# Altium integrated library analogboard_v2.IntLib: 537 symbols (part 2 of 4)
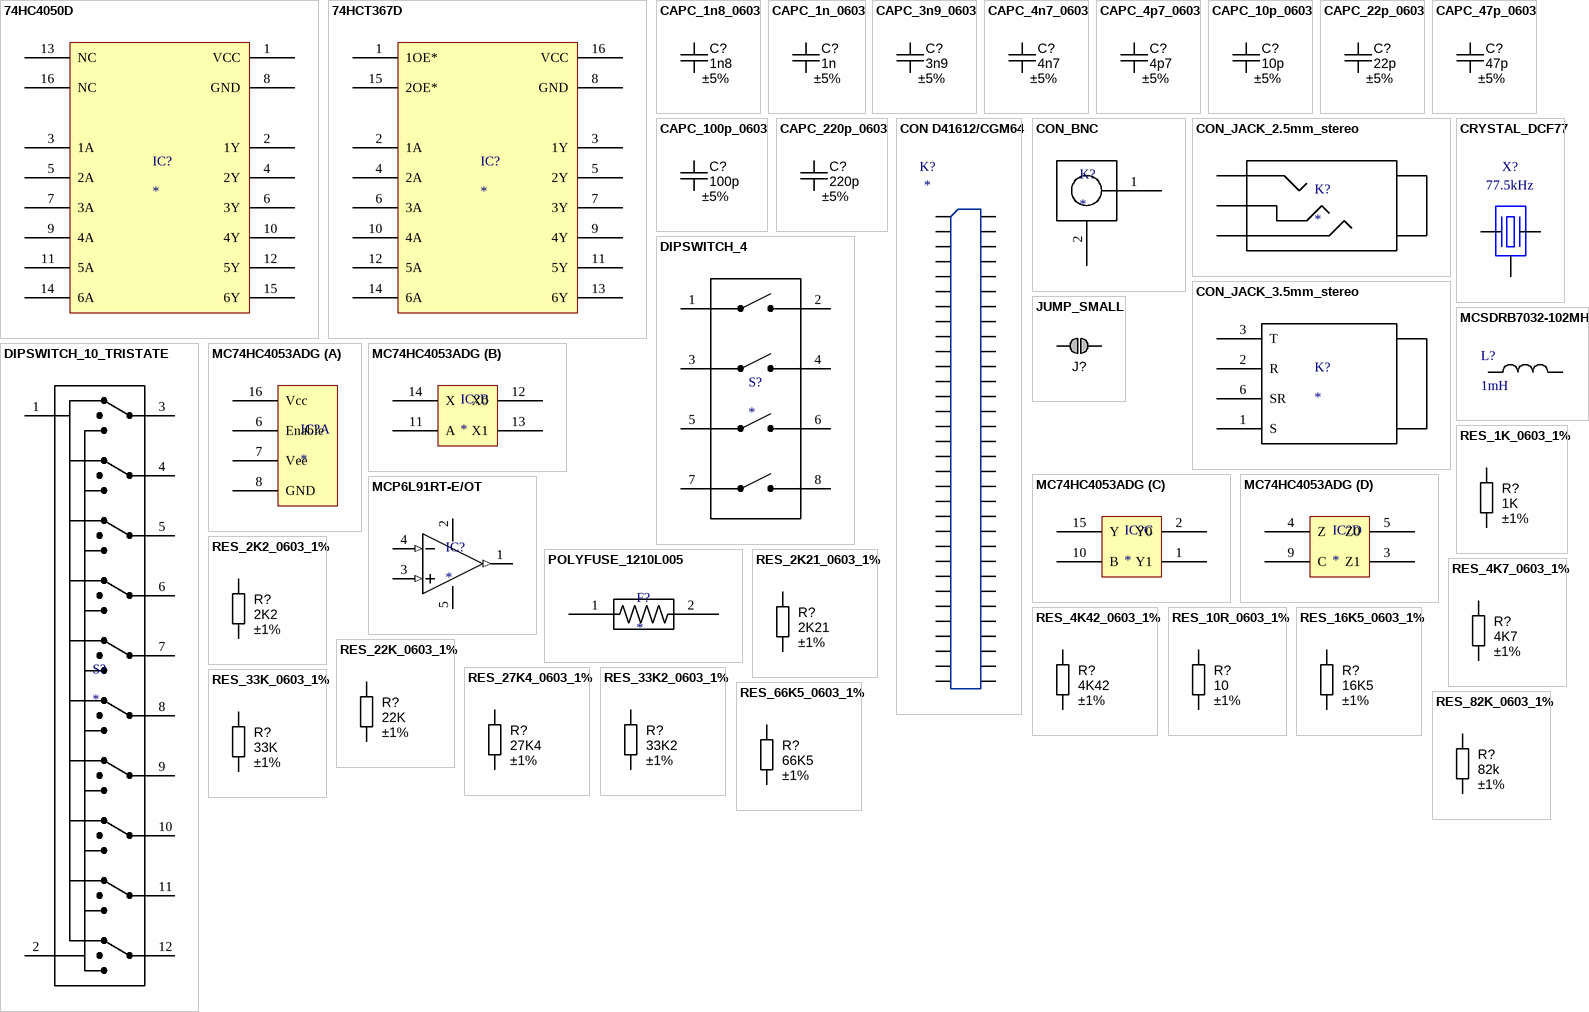
[diagram p32: symbols 74HC4050D to RES_82K_0603_1%]

## RES_16K5_0603_1%
designator R?, comment value 16K5  Tolerance: ±1%  (hidden comment: Thick Film)
Resistor SMD chip 16.5k Ohm 0.1W 1% 0603; Ratings: 1/10W; Package / Case: 0603 (1608 Metric)
footprint RESC1608N (Chip Resistor, Body 1.6x0.8mm, 0603, IPC Medium Density)
pins: 1, 2

## RES_22K_0603_1%
designator R?, comment value 22K  Tolerance: ±1%  (hidden comment: Thick Film)
Resistor SMD chip 22k Ohm 0.1W 1% 0603; Ratings: 1/10W; Package / Case: 0603 (1608 Metric)
footprint RESC1608N (Chip Resistor, Body 1.6x0.8mm, 0603, IPC Medium Density)
pins: 1, 2

## RES_27K4_0603_1%
designator R?, comment value 27K4  Tolerance: ±1%  (hidden comment: Thick Film)
Resistor SMD chip 27.4k Ohm 0.1W 1% 0603; Ratings: 1/10W; Package / Case: 0603 (1608 Metric)
footprint RESC1608N (Chip Resistor, Body 1.6x0.8mm, 0603, IPC Medium Density)
pins: 1, 2

## RES_33K2_0603_1%
designator R?, comment value 33K2  Tolerance: ±1%  (hidden comment: Thick Film)
Resistor SMD chip 33.2k Ohm 0.1W 1% 0603; Ratings: 1/10W; Package / Case: 0603 (1608 Metric)
footprint RESC1608N (Chip Resistor, Body 1.6x0.8mm, 0603, IPC Medium Density)
pins: 1, 2

## RES_33K_0603_1%
designator R?, comment value 33K  Tolerance: ±1%  (hidden comment: Thick Film)
Resistor SMD chip 33k Ohm 0.1W 1% 0603; Ratings: 1/10W; Package / Case: 0603 (1608 Metric)
footprint RESC1608N (Chip Resistor, Body 1.6x0.8mm, 0603, IPC Medium Density)
pins: 1, 2

## RES_66K5_0603_1%
designator R?, comment value 66K5  Tolerance: ±1%  (hidden comment: Thick Film)
Resistor SMD chip 66.5k Ohm 0.1W 1% 0603; Ratings: 1/10W; Package / Case: 0603 (1608 Metric)
footprint RESC1608N (Chip Resistor, Body 1.6x0.8mm, 0603, IPC Medium Density)
pins: 1, 2

## RES_82K_0603_1%
designator R?, comment value 82k  Tolerance: ±1%  (hidden comment: Thick Film)
Resistor SMD chip 82k Ohm 0.1W 1% 0603; Ratings: 1/10W; Package / Case: 0603 (1608 Metric)
footprint RESC1608N (Footprint not found)
pins: 1, 2

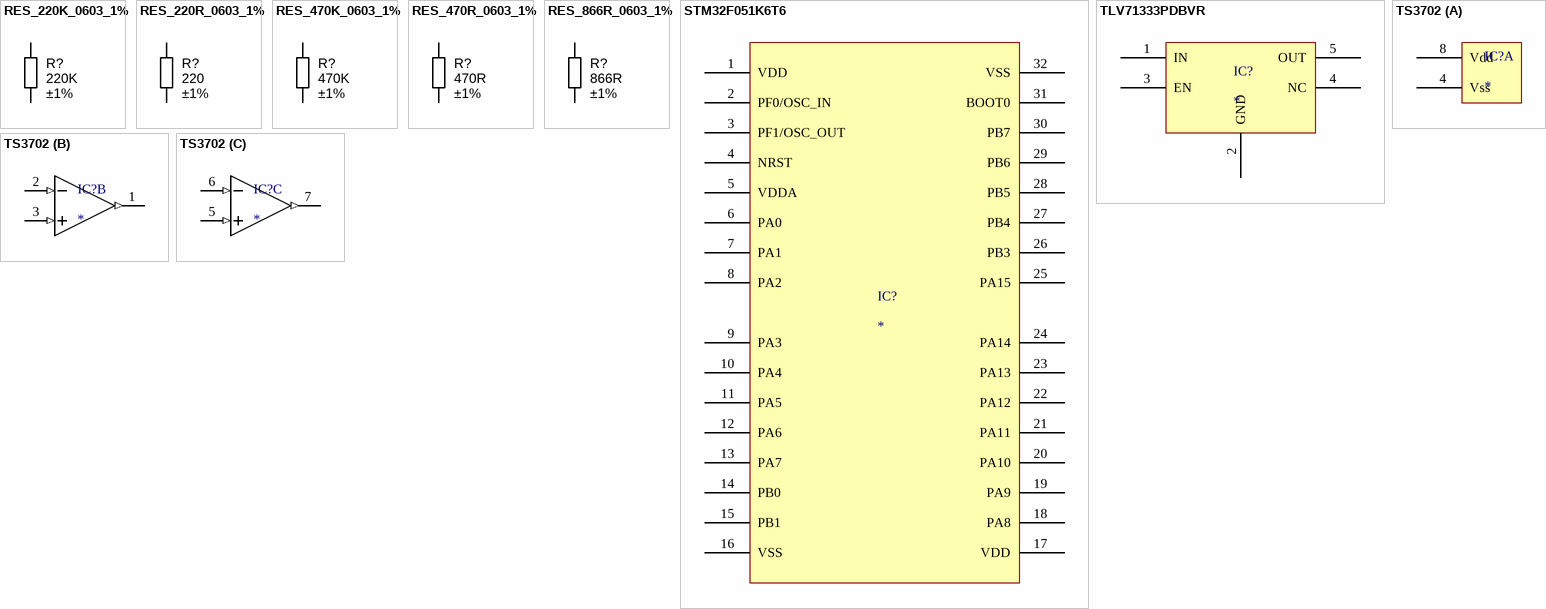
[diagram p6: symbols RES_220K_0603_1% to TS3702]

## RES_220K_0603_1%
designator R?, comment value 220K  Tolerance: ±1%  (hidden comment: Thick Film)
Resistor SMD chip 220k Ohm 0.1W 1% 0603; Ratings: 1/10W; Package / Case: 0603 (1608 Metric)
footprint RESC1608N (Chip Resistor, Body 1.6x0.8mm, 0603, IPC Medium Density)
pins: 1, 2

## RES_220R_0603_1%
designator R?, comment value 220  Tolerance: ±1%  (hidden comment: Thick Film)
Resistor SMD chip 220 Ohm 0.1W 1% 0603; Ratings: 1/10W; Package / Case: 0603 (1608 Metric)
footprint RESC1608N (Chip Resistor, Body 1.6x0.8mm, 0603, IPC Medium Density)
pins: 1, 2

## RES_470K_0603_1%
designator R?, comment value 470K  Tolerance: ±1%  (hidden comment: Thick Film)
Resistor SMD chip 470k Ohm 0.1W 1% 0603; Ratings: 1/10W; Package / Case: 0603 (1608 Metric)
footprint RESC1608N (Chip Resistor, Body 1.6x0.8mm, 0603, IPC Medium Density)
pins: 1, 2

## RES_470R_0603_1%
designator R?, comment value 470R  Tolerance: ±1%  (hidden comment: Thick Film)
Resistor SMD chip 470 Ohm 0.1W 1% 0603; Ratings: 1/10W; Package / Case: 0603 (1608 Metric)
footprint RESC1608N (Chip Resistor, Body 1.6x0.8mm, 0603, IPC Medium Density)
pins: 1, 2

## RES_866R_0603_1%
designator R?, comment value 866R  Tolerance: ±1%  (hidden comment: Thick Film)
Resistor SMD chip 866 Ohm 0.1W 1% 0603; Ratings: 1/10W; Package / Case: 0603 (1608 Metric)
footprint RESC1608N (Chip Resistor, Body 1.6x0.8mm, 0603, IPC Medium Density)
pins: 1, 2

## STM32F051K6T6
designator IC?
footprint LQFP32
pins: 1 VDD, 2 PF0/OSC_IN, 3 PF1/OSC_OUT, 4 NRST, 5 VDDA, 6 PA0, 7 PA1, 8 PA2, 9 PA3, 10 PA4, 11 PA5, 12 PA6, 13 PA7, 14 PB0, 15 PB1, 16 VSS, 17 VDD, 18 PA8, 19 PA9, 20 PA10, 21 PA11, 22 PA12, 23 PA13, 24 PA14, 25 PA15, 26 PB3, 27 PB4, 28 PB5, 29 PB6, 30 PB7, 31 BOOT0, 32 VSS

## TLV71333PDBVR
designator IC?
footprint SOT23-5
pins: 1 IN, 2 GND, 3 EN, 4 NC, 5 OUT

## TS3702
designator IC?
CMOS comparator (push-pull output)
footprint SOIC127P600X175-8AN (SOIC, 8-Leads, Body 4.9x3.9mm, Pitch 1.27mm, IPC Medium Density)
part A pins: 4 Vss, 8 Vdd
part B pins: 1 OUT (out), 2 IN- (in), 3 IN+ (in)
part C pins: 5 IN+ (in), 6 IN- (in), 7 OUT (out)


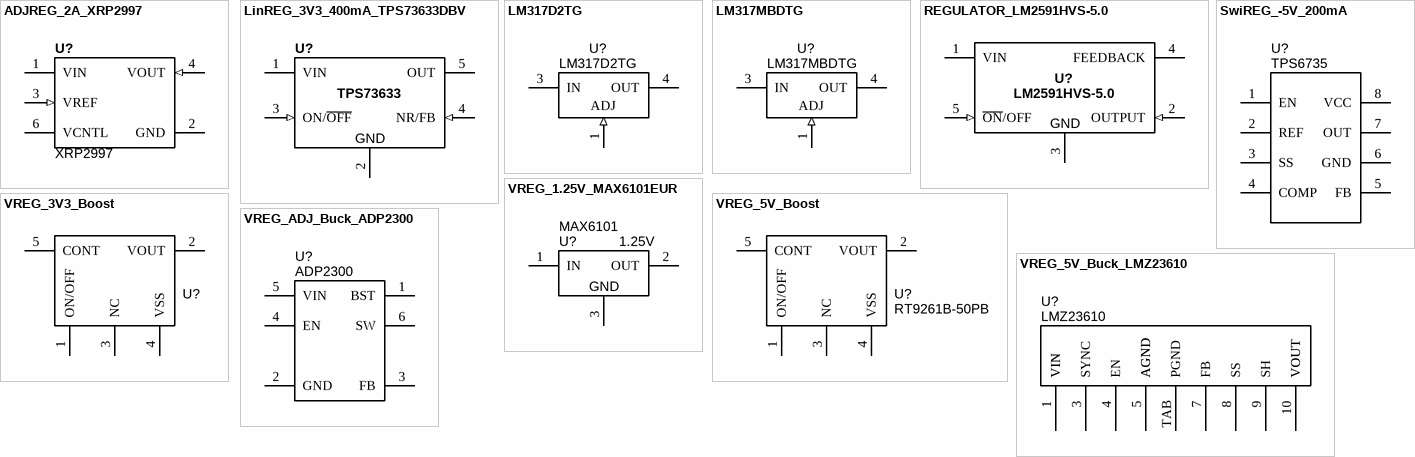
[diagram p7: symbols ADJREG_2A_XRP2997 to VREG_ADJ_Buck_ADP2300]

## ADJREG_2A_XRP2997
designator U?, comment XRP2997
IC Adjustable Regulator 2A 8-SOIC-EP SMD; Manufacturer 1: Exar Corporation; Manufacturer Part Number 1: XRP2997IDBTR-F; Voltage Regulator Type: Switching Buck; Tolerance: ±20mV; Ratings: 5.5Vin Max; Value: 3.3V; 400mA; Voltage - Input: 1.1V to 5.5V; Voltage - Dropout (Typical): 0.075V @ 400mA; Current - Output: 2A (Max); Package / Case: 8-SOIC (0.154", 3.90mm Width) Exposed Pad; Voltage - Output: Adjustable; Supplier 1: Digi-Key; Supplier Part Number 1: 1016-1702-1-ND; Operating Temperature: -40°C ~ 85°C
footprint SOIC127P600X175-9N (SOIC, 8-Leads with thermal tab, Body 4.9x3.9mm, Pitch 1.27mm, IPC Medium Density)
pins: 1 VIN (power), 2 GND (power), 3 VREF (in), 4 VOUT (in), 6 VCNTL (power), 9 GND (power) hidden to GND

## LinREG_3V3_400mA_TPS73633DBV
designator U?, comment 3.3V  (value not drawn)
IC LDO Regulator 3.3V 400mA SOT23-5 SMD; Manufacturer 1: Texas Instruments; Manufacturer Part Number 1: TPS73633DBVT; Voltage Regulator Type: Switching Buck; Tolerance: ±0.5%; Ratings: 5.5Vin Max; Value: 3.3V; 400mA; Regulator Topology: Positive Fixed; Voltage - Input: 3.5V to 5.5V; Voltage - Dropout (Typical): 0.075V @ 400mA; Current - Output: 400mA (Max); Package / Case: SOT23-5; Supplier 1: Digi-Key; Supplier Part Number 1: 296-15819-1-ND; Voltage - Output: 3.3V; Current - Limit (Min): 400mA; ComponentLink1URL: http://www.ti.com/lit/ds/symlink/tps73601.pdf; ComponentLink1Description: http://www.ti.com/lit/ds/symlink/tps73601.pdf
footprint SOT23-5
pins: 1 VIN (power), 2 GND (power), 3 ON/~{OFF} (in), 4 NR/FB (in), 5 OUT (power)

## LM317D2TG
designator U?, comment Manufacturer Part Number 1: LM317D2TG  (hidden comment: Adjustable)
Voltage Regulator IC, D2PAK SMD, LM317D2TG; Manufacturer 1: ON Semiconductor; Voltage Regulator Type: Adjustable Positive Linear; Tolerance: 0.04%; Ratings: 40V; 1.5A; Value: variable; Package / Case: D2PAK; Supplier 1: Digi-Key; Supplier Part Number 1: LM317D2TGOS-ND
footprint D2PAK-3 (D-PAK/TO-263-3; 3 Leads (1 Cropped); Body 14.7 (inc. leads) x 10.2 mm (LxW max))
pins: 1 ADJ (in), 3 IN (power), 4 OUT (power)

## LM317MBDTG
designator U?, comment Manufacturer Part Number 1: LM317MBDTG  (hidden comment: Adjustable)
Voltage Regulator IC, DPAK SMD, LM317MBDTG; Manufacturer 1: ON Semiconductor; Voltage Regulator Type: Adjustable Positive Linear; Tolerance: 0.04%; Ratings: 40V in-out; 500mA; Value: variable; Package / Case: DPAK/TO-252; Supplier 1: Digi-Key; Supplier Part Number 1: LM317MBDTGOS-ND
footprint TO-252 (D-PAK/TO-252-AA; 3 Leads (1 Cropped); Body 10.3 (inc. leads) x 6.7 mm (LxW max))
pins: 1 ADJ (in), 3 IN (power), 4 OUT (power)

## REGULATOR_LM2591HVS-5.0
designator U?, comment Manufacturer Part Number 1: LM2591HVS-5.0  (hidden comment: Adjustable)
Switching Voltage Regulator IC, TO-263-5 SMD, LM2591HVS-5.0; Manufacturer 1: National Semiconductor; Voltage Regulator Type: Switching Buck; Tolerance: ±4%; Ratings: 60Vin Max; 150kHz; Value: 5V; 1A; Package / Case: TO-263-5; Supplier 1: Digi-Key; Supplier Part Number 1: LM2591HVS-5.0-ND
footprint TO-263-5 (D-PAK/TO-263-5; 5 Leads; Body 14.4 (inc. leads) x 10.4 mm (LxW max))
pins: 1 VIN (power), 2 OUTPUT (in), 3 GND (power), 4 FEEDBACK (power), 5 ~{ON}/OFF (in)

## SwiREG_-5V_200mA
designator U?, comment TPS6735
IC REG 200mA -5V SOIC-8 SMD; Manufacturer 1: Texas Instruments; Manufacturer Part Number 1: TPS6735ID; Ratings: -5V @ 200mA; Output Type: Fixed; Voltage - Input: 4 V ~ 6.2 V; PWM Type: Current Mode; Frequency - Switching: 160kHz; Synchronous Rectifier: No; Supplier 1: Digi-Key; Supplier Part Number 1: 296-10982-5-ND; Type: Inverting; Voltage - Output: -5V; Operating Temperature: -40°C ~ 85°C; Supplier Device Package: 8-SOIC; ComponentLink1URL: http://www.ti.com/lit/ds/slvs141a/slvs141a.pdf; ComponentLink1Description: http://www.ti.com/lit/ds/slvs141a/slvs141a.pdf; Package / Case: 8-SOIC (0.154", 3.90mm Width)
footprint SOIC127P600X175-8AN (SOIC, 8-Leads, Body 4.9x3.9mm, Pitch 1.27mm, IPC Medium Density)
pins: 1 EN, 2 REF, 3 SS, 4 COMP, 5 FB, 6 GND, 7 OUT, 8 VCC

## VREG_1.25V_MAX6101EUR
designator U?, comment MAX6101  value 1.25V
Voltage Regulator 1.25V SOT23-3 SMD; Manufacturer 1: Maxim Integrated Products; Manufacturer Part Number 1: MAX6101EUR+T; Voltage Regulator Type: Adjustable Positive Linear; Tolerance: ±0.04%; Ratings: 40V in-out; 500mA; Package / Case: SOT23-3; Supplier 1: Digi-Key; Supplier Part Number 1: MAX6101EUR+TCT-ND
footprint SOT23-3 (SOT23, 3 pin)
pins: 1 IN (power), 2 OUT (power), 3 GND (power)

## VREG_3V3_Boost
designator U?  (value not drawn)
Regulator 3.3V Step-Up Converter; Manufacturer 1: Richtek USA Inc; Manufacturer Part Number 1: RT9261B-33GB; Ratings: 3.3V; 50mA; Output Type: Fixed; Voltage - Input: Up to 7V; PWM Type: VFM; Frequency - Switching: 190kHz; Current - Output: 50mA; Synchronous Rectifier: No; Package / Case: SOT-23-5; Type: Step-Up (Boost); Voltage - Output: 3.3V; Operating Temperature: -20°C ~ 85°C; ComponentLink1URL: http://www.richtek.com/download_ds.jsp?s=267; ComponentLink1Description: RT9261B-33GB Datasheet; Supplier Part Number 1: RT9261B-33GB-ND; Supplier 1: Digi-Key
footprint SOT23-5
pins: 1 ON/OFF, 2 VOUT, 3 NC, 4 VSS, 5 CONT

## VREG_5V_Boost
designator U?  Manufacturer Part Number 1: RT9261B-50PB  (hidden comment: *)
Regulator, VFM Step-Up DC/DC Converter; Manufacturer 1: Richtek; Ratings: 5V; Package / Case: SOT-23-5
footprint SOT23-5
pins: 1 ON/OFF, 2 VOUT, 3 NC, 4 VSS, 5 CONT

## VREG_5V_Buck_LMZ23610
designator U?, comment LMZ23610
Voltage Regulator 10A 5V TO-PMOD-11; Manufacturer 1: National Semiconductor (TI); Manufacturer Part Number 1: LMZ23610TZ/NOPB; Ratings: 6Vin; 50W; Tolerance: ±0.2%; Value: Variable; Supplier 1: Digi-Key; Supplier Part Number 1: LMZ23610TZ/NOPB-ND; ComponentLink1URL: http://www.ti.com/lit/ds/symlink/lmz23610.pdf; ComponentLink1Description: http://www.ti.com/lit/ds/symlink/lmz23610.pdf
footprint NATIONALSEMI-TZA11A (National Semi TZA11A package)
pins: 1 VIN, 2 VIN, 3 SYNC, 4 EN, 5 AGND, 6 AGND, 7 FB, 8 SS, 9 SH, 10 VOUT, 11 VOUT, TAB PGND

## VREG_ADJ_Buck_ADP2300
designator U?, comment ADP2300
Regulator adjustable switching step-down DC/DC converter; Manufacturer 1: Analog Devices Inc; Manufacturer Part Number 1: ADP2300AUJZ-R7; Ratings: Adj; 1.2A; Package / Case: SOT-23-6; Supplier 1: Digi-Key; Supplier Part Number 1: ADP2300AUJZ-R7CT-ND; ComponentLink1URL: http://www.analog.com/static/imported-files/data_sheets/ADP2300_2301.pdf; ComponentLink1Description: http://www.analog.com/static/imported-files/data_sheets/ADP2300_2301.pdf
footprint SOT23-6
pins: 1 BST, 2 GND, 3 FB, 4 EN, 5 VIN, 6 SW


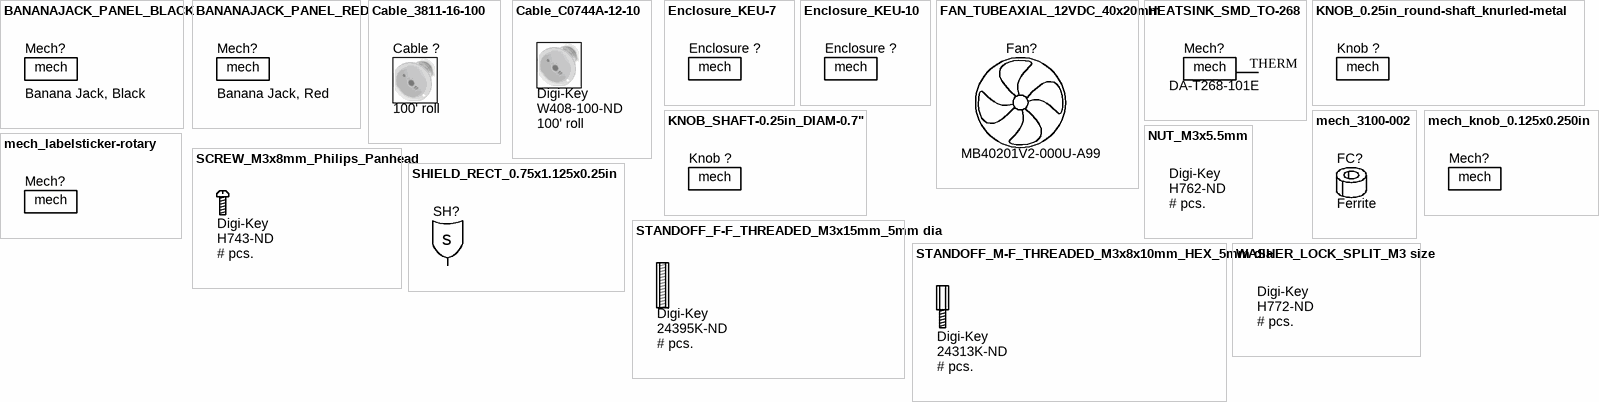
[diagram p8: symbols BANANAJACK_PANEL_BLACK to WASHER_LOCK_SPLIT_M3 size]

## BANANAJACK_PANEL_BLACK
designator Mech?, comment Banana Jack, Black  (mechanical)
Banana jack panel mount black; Manufacturer 1: Emerson Network Power Connectivity Solutions; Manufacturer Part Number 1: 108-0903-001; Supplier 1: Digi-Key; Supplier Part Number 1: J152-ND

## BANANAJACK_PANEL_RED
designator Mech?, comment Banana Jack, Red  (mechanical)
Banana jack panel mount red; Manufacturer 1: Emerson Network Power Connectivity Solutions; Manufacturer Part Number 1: 108-0902-001; Supplier 1: Digi-Key; Supplier Part Number 1: J151-ND

## Cable_3811-16-100
designator Cable ?, comment 100' roll  (mechanical)
Ribbon cable 26 AWG 16-conductor 1.27mm pitch; Manufacturer 1: 3M; QtyOverride: .01; Value: 1' section; Number of Conductors: 16; Voltge Rating: 300 V; Stranding: 7 x 34 AWG; Supplier 1: Mouser; Supplier Part Number 1: 517-3811/16; Manufacturer Part Number 1: 3811/16-100; Parameter Name: Ribbon Cable; Color: Multicolor

## Cable_C0744A-12-10
designator *, comment 100' roll  Supplier 1: Digi-Key  Supplier Part Number 1: W408-100-ND
Cable, SHIELDED 24AWG UL2464 8 COND; Manufacturer 1: General Cable/Carol Brand; Manufacturer Part Number 1: C0744A-12-10; Cable Type: Multi-Conductor; Conductor Insulation: Poly-Vinyl Chloride (PVC); Conductor Material: Copper, Tinned; Conductor Strand: 7 Strands / 32 AWG; Jacket (Insulation) Diameter: 0.215" (5.46mm); Jacket (Insulation) Thickness: 0.032" (0.81mm); Number of Conductors: 8; Shield Coverage: 100%; Shield Material: Flexfoil®; Shield Type: Foil; Usage: Computer; Voltage: 300V; QtyOverride: .12; Value: 5' section; Category: Cables Wires; Color: Gray; Features: Drain Wire; Jacket (Insulation) Material: Poly-Vinyl Chloride (PVC); Length: 100' (30.5m); Operating Temperature: -20°C ~ 80°C; Wire Gauge: 24 AWG; ComponentLink1URL: http://www.generalcable.com/NR/rdonlyres/E79F504B-B22F-45DB-9843-849435C5B1BE/0/Pg39_40MltiCondfoilShield.pdf; ComponentLink1Description: http://www.generalcable.com/NR/rdonlyres/E79F504B-B22F-45DB-9843-849435C5B1BE/0/Pg39_40MltiCondfoilShield.pdf; Package / Case: 100' roll
footprint ClarisonicLogo (Clarisonic Logo 0.360" height)

## Enclosure_KEU-7
designator Enclosure ?  (value not drawn)  (mechanical)
Enclosure with keyboard panel 5.1x7.1x3.0in; Manufacturer 1: PacTec; Manufacturer Part Number 1: 63100-510-000; Supplier 1: Mouser; Supplier Part Number 1: 616-63100-510-000

## Enclosure_KEU-10
designator Enclosure ?  (value not drawn)  (mechanical)
Enclosure with keyboard panel 8.1x10.1x4.0in; Manufacturer 1: PacTec; Manufacturer Part Number 1: 62291-510-000 KEU-10 Black Kit; Supplier 1: Mouser; Supplier Part Number 1: 616-62291-510-000; ComponentLink1URL: http://www.pactecenclosures.com/Plastic-Enclosures/drw_KEU-10.pdf; ComponentLink1Description: http://www.pactecenclosures.com/Plastic-Enclosures/drw_KEU-10.pdf

## FAN_TUBEAXIAL_12VDC_40x20mm
designator Fan?, comment Manufacturer Part Number 1: MB40201V2-000U-A99  (hidden comment: tubeaxial fan)  (mechanical)
Fan tubeaxial 40x20mm 7.7 CFM 21 dBA 12 VDC; Manufacturer 1: Sunon Fans; Noise: 21 dB(A); RPM: 6200 RPM; Power Rating: 0.60W; Voltage - Rated: 12VDC; Supplier 1: Digi-Key; Supplier Part Number 1: 259-1554-ND; ComponentLink1URL: http://www.sunon.com.tw/products/pdf/DCFAN/MB4020.pdf; ComponentLink1Description: http://www.sunon.com.tw/products/pdf/DCFAN/MB4020.pdf; Size / Dimension: Square - 40mm L x 40mm H x 20mm W; Weight: 0.068 lb (30.84g)

## HEATSINK_SMD_TO-268
designator Mech?, comment Manufacturer Part Number 1: DA-T268-101E  (hidden comment: SMD heat sink)
Heat sink for TO-268 SMD; Manufacturer 1: Ohmite; For Use With/Related Products: Rotary Switches and Encoders; Power Dissipation @ Temperature Rise: 5W @ 35°C; Supplier 1: Digi-Key; Supplier Part Number 1: DA-T268-101E-ND; Height Off Base (Height of Fin): 0.400" (10.16mm); Length: 0.500" (12.70mm); Supplier 2: Digi-Key; Supplier Part Number 2: DV-T268-101E-ND; Manufacturer 2: Ohmite; Manufacturer Part Number 2: DV-T268-101E
footprint HEATSINK_TO-268 (SMD heatsink for use with TO-268 / D3-PAK component)
pins: THERM GND

## KNOB_0.25in_round-shaft_knurled-metal
designator Knob ?, comment round knurled knob  (value not drawn)  (mechanical)
Knob metal 0.25in diameter clear matte; Manufacturer 1: Kilo International; Manufacturer Part Number 1: OESA-50-3-5; Accessory Type: Knob - Metal; For Use With/Related Products: 1/4" round shaft potentiometers; Knob / Dial Style: Round 12.7mm with 17.4mm skirt; Shaft Diameter: 6.35mm; Shaft Type: Round; Knob Material: metal; Color: Clear matte; Supplier 1: Digi-Key; Supplier Part Number 1: 226-3148-ND; ComponentLink1URL: http://media.digikey.com/pdf/Data%20Sheets/Kilo%20International%20PDFs/OES.pdf; ComponentLink1Description: http://media.digikey.com/pdf/Data%20Sheets/Kilo%20International%20PDFs/OES.pdf

## KNOB_SHAFT-0.25in_DIAM-0.7"
designator Knob ?, comment round fluted knob  (value not drawn)  (mechanical)
Knob plastic 0.125in diameter black; Manufacturer 1: GRAYHILL; Manufacturer Part Number 1: 11K5014-KCNB; Accessory Type: Knob - Black; For Use With/Related Products: Rotary Switches and Encoders; Shaft Diameter: 6.35; Knob Material: Nylon; Knob Dia - Imperial: 0.7"; Knob Dia - Metric: 17.78; ComponentLink1URL: http://www.grayhill.com/web1/pdf/control%20knob%20accessories%20encoder.pdf; ComponentLink1Description: http://www.grayhill.com/web1/pdf/control%20knob%20accessories%20encoder.pdf; Supplier 1: Newark; Supplier Part Number 1: 05C2120; Knob / Dial Style: Round Fluted; Shaft Type: Round; Color: Black

## mech_3100-002
designator FC?, comment Material: Ferrite  (hidden comment: Steward, Inc.)  (mechanical)
Ferrite Core Toroid; Manufacturer Part Number 1: HFB095051-100; Manufacturer 1: Steward, Inc.; Manufacturer 2: Ferrico, Inc.; Manufacturer Part Number 2: K3 RH9.5X10.0X5.0

## mech_knob_0.125x0.250in
designator Mech?  (value not drawn)  (mechanical)
Knob plastic 0.125in diameter black; Manufacturer 1: Grayhill Inc; Manufacturer Part Number 1: 11K5017-JCNB; Accessory Type: Knob - Black; For Use With/Related Products: Rotary Switches and Encoders; Supplier 1: Digi-Key; Supplier Part Number 1: GH7335-ND; ComponentLink1URL: http://www.grayhill.com/web1/pdf/control%20knob%20accessories%20encoder.pdf; ComponentLink1Description: http://www.grayhill.com/web1/pdf/control%20knob%20accessories%20encoder.pdf

## mech_labelsticker-rotary
designator Mech?  (value not drawn)  (mechanical)
Label sticker for rotary switch; Manufacturer 1: Grayhill Inc; Manufacturer Part Number 1: 71SS1073-1; Accessory Type: Stop Pin Sticker; For Use With/Related Products: 71AD Series; Supplier 1: Digi-Key; Supplier Part Number 1: 71SS1073-1-ND; ComponentLink1URL: http://lgrws01.grayhill.com/web1/images/ProductImages/Rotary_71.pdf; ComponentLink1Description: http://lgrws01.grayhill.com/web1/images/ProductImages/Rotary_71.pdf

## NUT_M3x5.5mm
designator *, comment # pcs.  Supplier 1: Digi-Key  Supplier Part Number 1: H762-ND  (mechanical)
NUT HEX METRIC M 3 ZINC; Manufacturer 1: B&F Fastener Supply; Manufacturer Part Number 1: MHNZ 003; Thread Size: M3; RoHS: RoHS non-compliant; Description 1: NUT HEX METRIC M 3 ZINC; Category: Hardware Fasteners Accessories; Stock 1: 9500; Pricing 1: 100=0.0384, 1000=0.03072 (USD); Type: Hex; Thickness: -; Width: 0.217" (5.5mm); Quantity: -; Material: -; Plating: Zinc

## SCREW_M3x8mm_Philips_Panhead
designator *, comment # pcs.  Supplier 1: Digi-Key  Supplier Part Number 1: H743-ND  (mechanical)
SCREW MACHINE METRIC PH M3X8MM; Manufacturer 1: B&F Fastener Supply; Manufacturer Part Number 1: MPMS 003 0008 PH; Screw Head Type: Phillips Panhead; Thread Size: M3; Head Height: 0.090" (2.29mm); Plating: Zinc; RoHS: RoHS non-compliant; Description 1: SCREW MACHINE METRIC PH M3X8MM; Category: Hardware Fasteners Accessories; Stock 1: 8200; Pricing 1: 100=0.066, 1000=0.0528 (USD); Type: Machine Screw; Length - Below Head: 0.315" (8.00mm); Material: -; ComponentLink1URL: http://www.fasnetdirect.com/refguide/Machinepancombo.pdf; ComponentLink1Description: http://www.fasnetdirect.com/refguide/Machinepancombo.pdf

## SHIELD_RECT_0.75x1.125x0.25in
designator SH?  (value not drawn)
Fotofab standard RF shield 0.75x1.125x0.25in; Supplier 1: Digi-Key; Supplier Part Number 1: 655-1002-ND; Manufacturer 1: Fotofab; Manufacturer Part Number 1: 0.75 X 1.125 X 0.25
footprint SHIELD_RECT_0.75x1.125x0.25in (Fotofab standard RF shield, 1.125"x0.75", 0.25" tall)
pins: SH

## STANDOFF_F-F_THREADED_M3x15mm_5mm dia
designator *, comment # pcs.  Supplier 1: Digi-Key  Supplier Part Number 1: 24395K-ND  (mechanical)
STANDOFF METRIC HEX M3 THD 15MM; Manufacturer 1: Keystone Electronics; Manufacturer Part Number 1: 24395; Thread/Screw/Hole Size: M3 Thread; Plating: Nickel; Between Board Height: 0.591" (15.0mm); RoHS: RoHS Compliant; Description 1: STANDOFF METRIC HEX M3 THD 15MM; Category: Hardware Fasteners Accessories; Stock 1: 2380; Pricing 1: 10=0.79, 100=0.7595, 500=0.4995, 1000=0.3189, 2500=0.2962 (USD); Type: Hex Threaded, Female/Female; Size: 0.197" (5.0mm) Hex; Length - Overall: 0.590" (15.0mm); Material: Brass; Color: Natural; ComponentLink1URL: http://www.keyelco.com/pdfs/M55-prod30.pdf; ComponentLink1Description: http://www.keyelco.com/pdfs/M55-prod30.pdf

## STANDOFF_M-F_THREADED_M3x8x10mm_HEX_5mm dia
designator *, comment # pcs.  Supplier 1: Digi-Key  Supplier Part Number 1: 24313K-ND  (mechanical)
STANDOFF M/F MET 5MM HEX 10MM L; Manufacturer 1: Keystone Electronics; Manufacturer Part Number 1: 24313; Thread/Screw/Hole Size: M3 Thread; Plating: Nickel; Between Board Height: 0.394" (10.0mm); RoHS: RoHS Compliant; Description 1: STANDOFF M/F MET 5MM HEX 10MM L; Category: Hardware Fasteners Accessories; Stock 1: 240; Pricing 1: 10=0.969, 100=0.881, 500=0.58, 1000=0.3685, 2500=0.34215 (USD); Type: Hex Threaded, Male/Female; Size: 0.197" (5.0mm) Hex; Length - Overall: 0.709" (18.0mm); Material: Brass; Color: Natural; ComponentLink1URL: http://www.keyelco.com/pdfs/M55p67.pdf; ComponentLink1Description: http://www.keyelco.com/pdfs/M55p67.pdf

## WASHER_LOCK_SPLIT_M3 size
designator *, comment # pcs.  Supplier 1: Digi-Key  Supplier Part Number 1: H772-ND  (mechanical)
WASHER SPLIT LOCK METRIC M 3 ZINC; Manufacturer 1: B&F Fastener Supply; Manufacturer Part Number 1: MLWZ 003; Description 1: WASHER LOCK METRIC M 3 ZINC; Thread/Screw/Hole Size: Metric 3; Category: Hardware Fasteners Accessories; Type: Split Lock; Diameter - Inside: 0.122" (3.1mm); Diameter - Outside: 0.217" (5.5mm); Thickness: 0.039" (1.0mm); Plating: Zinc; Material: Steel


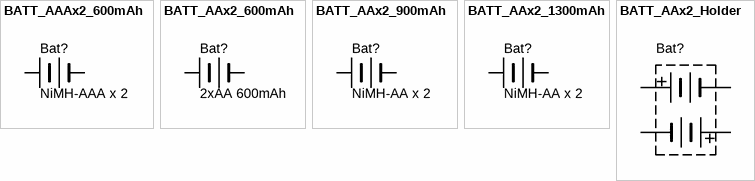
[diagram p9: symbols BATT_AAAx2_600mAh to BATT_AAx2_Holder]

## BATT_AAAx2_600mAh
designator Bat?, comment NiMH-AAA x 2  (no BOM)
Battery pack, 2-cell AAA; Manufacturer 1: JJJ; Manufacturer Part Number 1: NiMH-AAA-2-600-PB7; Ratings: 600 mAh; Package / Case: per dwg
footprint BAT-AAA-2 (AAA battery pack, 2 side by side)
pins: 1, 2

## BATT_AAx2_600mAh
designator Bat?, comment 2xAA 600mAh  (no BOM)
Battery pack NiMH 600mAh 2-cell AA; Manufacturer 1: Gold Peak; Manufacturer Part Number 1: 60AAM2B2H PB3; Package / Case: per dwg; Ratings: 600 mAh
footprint BAT-AA-2 (AA battery, 2 side by side)
pins: 1, 2

## BATT_AAx2_900mAh
designator Bat?, comment NiMH-AA x 2  (no BOM)
Battery pack, 2-cell AA; Manufacturer 1: JJJ; Manufacturer Part Number 1: NiMH-AA-2-900-PB3; Ratings: 900 mAh; Package / Case: per dwg
footprint BAT-AA-2 (AA battery, 2 side by side)
pins: 1, 2

## BATT_AAx2_1300mAh
designator Bat?, comment NiMH-AA x 2  (no BOM)
Battery pack, 2-cell AA; Manufacturer 1: JJJ; Manufacturer Part Number 1: NiMH-AA-2-1300-PB1; Ratings: 1300 mAh; Package / Case: per dwg
footprint BAT-AA-2 (AA battery, 2 side by side)
pins: 1, 2

## BATT_AAx2_Holder
designator Bat?, comment NiMH-AA x 2  (value not drawn)
Battery holder 2xAA PCB mount; Manufacturer 1: MPD (Memory Protection Devices); Manufacturer Part Number 1: BK-6100-PC4; Ratings: 1300 mAh; Battery Type, Function: Cylindrical, Holder; Style: Holder (Open); Battery Cell Size: AA; Number of Cells: 2; Package / Case: per dwg; Supplier 1: Digi-Key; Supplier Part Number 1: BK-6100-PC4-ND; Mounting Type: PCB, Through Hole; Height Above Board: 0.657" (16.69mm); ComponentLink1URL: http://www.memoryprotectiondevices.com/datasheets/BK-6100-PC4-datasheet.pdf; ComponentLink1Description: http://www.memoryprotectiondevices.com/datasheets/BK-6100-PC4-datasheet.pdf
footprint BATT_HOLDER_2XAA (2-cell AA battery holder)
pins: C1+, C1-, C2+, C2-


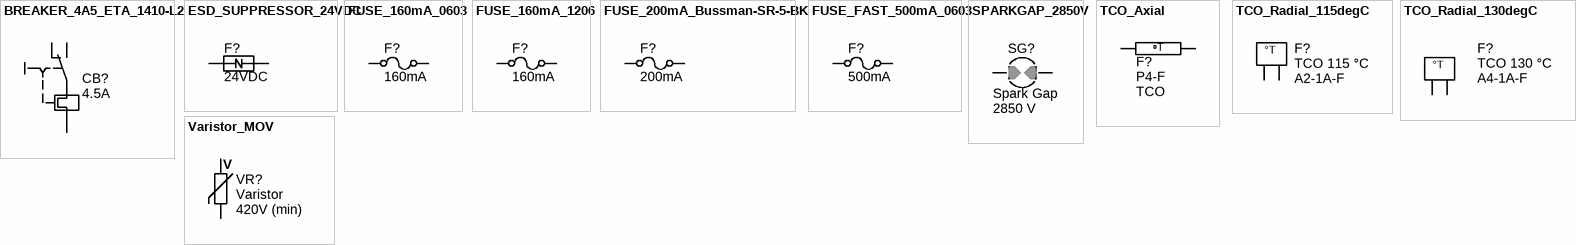
[diagram p10: symbols BREAKER_4A5_ETA_1410-L2 to Varistor_MOV]

## BREAKER_4A5_ETA_1410-L2
designator CB?, comment value 4.5A  (hidden comment: thermal breaker)
Circuit breaker 4.5A PCB mount; Manufacturer 1: E-T-A; Manufacturer Part Number 1: 1410-L210-L2F1-S02-4.5A; Ratings: 4.5A; 28VDC; 240VAC; Voltage: 28VDC, 240VAC; Supplier 1: Digi-Key; Supplier Part Number 1: 302-1036-ND; Current - Trip (It): 4.5A
footprint BREAKER_1410-L2 (E-T-A Thermal Overcurrent Circuit Breaker 1410-L2)
pins: 1, 2, 3

## ESD_SUPPRESSOR_24VDC
designator F?, comment value 24VDC  (hidden comment: ESD suppressor)
ESD Suppressor 24VDC 0603 SMD; Manufacturer 1: Cooper Bussmann; Manufacturer Part Number 1: 0603ESDA-TR1; Voltage - Working: 24V; Voltage - Clamping: 35V; Package / Case: 0603 (1608 metric); Supplier 1: Digi-Key; Supplier Part Number 1: 283-2535-1-ND; ComponentLink1URL: http://www.cooperindustries.com/content/dam/public/bussmann/Electronics/Resources/Data%20Sheets/Bus_Elx_DS_4082_0603ESDA-TR.pdf; ComponentLink1Description: http://www.cooperindustries.com/content/dam/public/bussmann/Electronics/Resources/Data%20Sheets/Bus_Elx_DS_4082_0603ESDA-TR.pdf
footprint 0603ESDA (Chip ESD suppressor, Body 1.6x0.8mm, 0603, IPC Medium Density)
pins: 1, 2

## FUSE_160mA_0603
designator F?, comment value 160mA  (hidden comment: Slow-blow)
Fuse 160mA 63VDC 0603 SMD; Manufacturer 1: Holly Fuse; Manufacturer Part Number 1: 06T-0160L; Ratings: 160mA; 63VDC; slow-blow; Package / Case: 0603 (1608 metric)
footprint RESC1608N (Chip Resistor, Body 1.6x0.8mm, 0603, IPC Medium Density)
pins: 1, 2

## FUSE_160mA_1206
designator F?, comment value 160mA  (hidden comment: Slow-blow)
Fuse 160mA 63VDC 1206 SMD; Manufacturer 1: Holly Fuse; Manufacturer Part Number 1: 12T-0160L; Ratings: 160mA; 63VDC; slow-blow; Package / Case: 1206 (3216 metric)
footprint RESC3216N (Chip Resistor, Body 3.2x1.6mm, IPC Medium Density)
pins: 1, 2

## FUSE_200mA_Bussman-SR-5-BK
designator F?, comment value 200mA  (hidden comment: Slow-blow)
Fuse 200mA 250VAC Radial 5.08mm pitch; Manufacturer 1: Cooper Bussmann; Manufacturer Part Number 1: SR-5-200MA-BK; Ratings: 200mA; 250VAC; slow-blow; Package / Case: Radial 5.08mm pitch; Supplier 1: Mouser; Supplier Part Number 1: 504-SR-5-200MA-BK
footprint FUSE_SR-5-BK
pins: 1, 2

## FUSE_FAST_500mA_0603
designator F?, comment value 500mA  (hidden comment: Fast Acting)
Fuse 500mA 32VDC 0603 SMD; Manufacturer: AVX Corporation; Manufacturer Part Number: F0603E0R50FSTR; Ratings: 500mA; 32VDC; fast acting; DC Cold Resistance: 0.25 Ohm; Package / Case: 0603 (1608 metric); Fuse Type: Fast Acting; ComponentLink1URL: http://www.avx.com/docs/Catalogs/accug2.pdf; ComponentLink1Description: http://www.avx.com/docs/Catalogs/accug2.pdf; Supplier 1: Digi-Key; Supplier Part Number 1: 478-2860-1-ND; Operating Temperature: -55°C ~ 125°C
footprint RESC1608N (Chip Resistor, Body 1.6x0.8mm, 0603, IPC Medium Density)
pins: 1, 2

## SPARKGAP_2850V
designator SG?, comment Spark Gap  value 2850 V  (no BOM)
Fuse 160mA 63VDC 1206 SMD
footprint Spark-Gap_2850V (Spark gap, voltage approx 2850 per (3000 pd + 1350))
pins: 1, 2

## TCO_Axial
designator F?, comment TCO  Manufacturer Part Number 1: P4-F
Thermal cutoff axial 2 Amp 130 deg C; Manufacturer 1: Aupo; Ratings: 130°C; 2.0A; 250Vac; Package / Case: diam. 2.1 x 6.5mm
footprint AUPO_P-4F_BEND1 (Aupo P-4F TCO for positioning on IC legs)
footprint AUPO_P-4F_BEND2 (Aupo P-4F TCO for positioning on IC legs)
footprint AUPO_P-4F_BEND3 (Aupo P-4F TCO for positioning on IC legs)
footprint AUPO_P-4F_BEND4 (Aupo P-4F TCO for positioning on IC legs)
footprint AUPO_P-4F_BEND5 (Aupo P-4F TCO for positioning on IC legs)
pins: 1, 2

## TCO_Radial_115degC
designator F?, comment TCO 115 °C  Manufacturer Part Number 1: A2-1A-F
Thermal cutoff radial 1 Amp 115 degrees C; Manufacturer 1: Aupo; Ratings: 115°C; 1.0A; 250Vac; Package / Case: 5.2W x 4.0H x 3.5mm Pitch
footprint TCO_Aupo_Ax-1A_Radial_THD (thermal fuse, Ax-1A)
pins: 1, 2

## TCO_Radial_130degC
designator F?, comment TCO 130 °C  Manufacturer Part Number 1: A4-1A-F
Thermal cutoff radial 1 Amp 130 degrees C; Manufacturer 1: Aupo; Ratings: 130°C; 1.0A; 250Vac; Package / Case: 5.2W x 4.0H x 3.5mm Pitch
pins: 1, 2

## Varistor_MOV
designator VR?, comment Varistor  Ratings: 420V (min)
Varistor 420V min; Manufacturer 1: Bourns Inc.; Manufacturer Part Number 1: MOV-10D621K; Voltage: 620V; Supplier 1: Digi-Key; Supplier Part Number 1: MOV-10D621K-ND
footprint Varistor_7.62and10mm (Capacitor, Ceramic, Thru-Hole, Dipped Radial; Body 6.8 x 3 mm (WxT) Pin Spacing 7.62 mm (typ))
pins: 1, 2


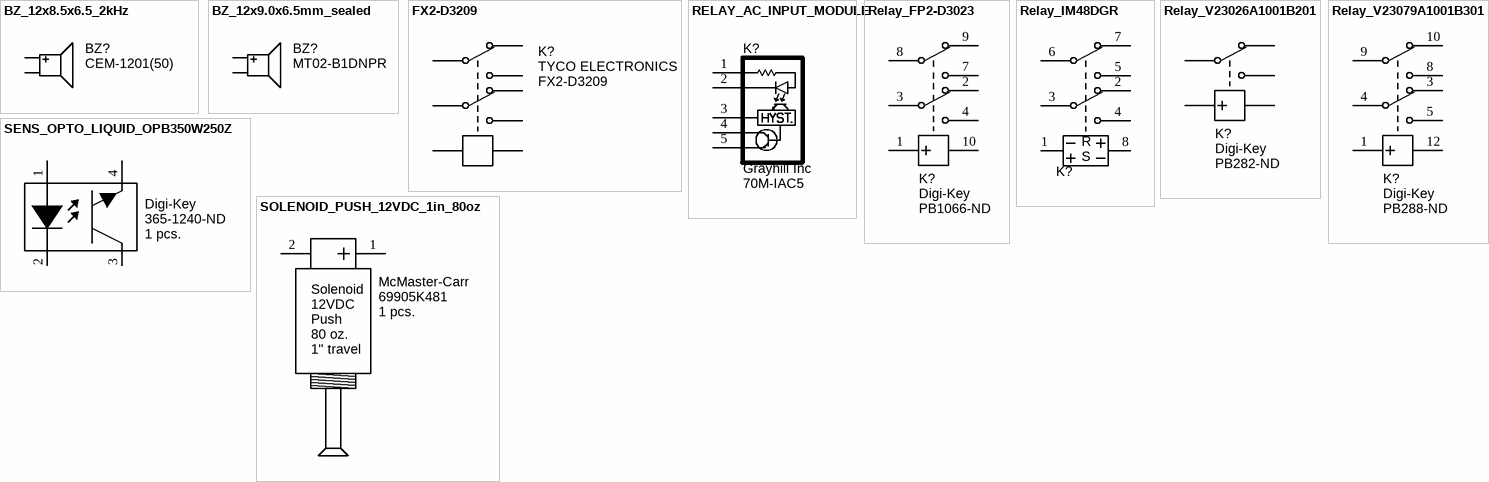
[diagram p11: symbols BZ_12x8.5x6.5_2kHz to SOLENOID_PUSH_12VDC_1in_80oz]

## BZ_12x8.5x6.5_2kHz
designator BZ?, comment Manufacturer Part Number 1: CEM-1201(50)  (hidden comment: Alternate part: 3100-932)
Speaker, Magnetic Transducer; Manufacturer 1: CUI Inc; Ratings: 2048 ±200 Hz; Package / Case: 6.5mm pitch; Material: Noryl SE1-J; Supplier 1: Digi-Key; Supplier Part Number 1: 102-1152-ND
footprint BUZZER_12.0X8.5MM
pins: 1 Positive, 2 Negative

## BZ_12x9.0x6.5mm_sealed
designator BZ?, comment Manufacturer Part Number 1: MT02-B1DNPR  (hidden comment: Alternate part: 3100-842)
Buzzer THD sealed 12.0 x 9.0mm DxH 6.5mm pitch; Manufacturer 1: SPL (Hong Kong) Limited; Ratings: 2048 Hz; Package / Case: 6.5mm pitch; Material: Noryl
footprint BUZZER_12.0X8.5MM
pins: 1 Positive, 2 Negative

## FX2-D3209
designator K?  Manufacturer 1: TYCO ELECTRONICS  Manufacturer Part Number 1: FX2-D3209  (hidden comment: *)
TYCO ELECTRONICS - FX2-D3209 - RELAY, PCB, DPCO, 5VDC; Voltage, Coil DC Nom: 5; Coil Resistance: 178; No. of Poles: 2; Contact Configuration: DPDT; Voltage, Contact AC Max: 250; Voltage, Contact DC Max: 220; Supplier 1: Newark; Supplier Part Number 1: 97K0381; Category: Switches & Relays; Series: FX2; Max Contact Current AC: 2; ComponentLink1URL: http://www.farnell.com/datasheets/68394.pdf; ComponentLink1Description: http://www.farnell.com/datasheets/68394.pdf
footprint Relay_Tyco_FX2 (Tyco FX2 DPDT 5VDC Relay)
pins: 1, 2, 3, 4, 5, 6, 7, 8

## RELAY_AC_INPUT_MODULE
designator K?  Manufacturer 1: Grayhill Inc  Manufacturer Part Number 1: 70M-IAC5
Style: Standard; Voltage - Input: 90 ~ 140VAC (120VAC Nom); Current - Input: 8mA; Logic Supply Voltage (Output): 5VDC (3 ~ 6VDC); Logic Supply Current (Output): 10mA; Turn On Time: 20ms; Description 1: MODL MINI AC INPUT 5V OUTPUT; RoHS: RoHS Compliant By Exemption; Category: Relays; Type: AC; Color: Yellow; Turn Off Time: 20ms; Features: Hold Down Screw; ComponentLink1URL: http://lgrws01.grayhill.com/web/images/ProductImages/AC%20Input%20Modules.pdf; ComponentLink1Description: http://lgrws01.grayhill.com/web/images/ProductImages/AC%20Input%20Modules.pdf; Supplier 1: Digi-Key; Supplier Part Number 1: GH7026-ND; Stock 1: 72; Pricing 1: 1=9.59, 10=8.633, 100=8.153, 250=7.674, 500=6.714 (USD)
pins: 1, 2, 3, 4, 5
